# Altium footprint library Cyberdeck.PcbLib: 261 footprints (part 3 of 17)
Each footprint in its own frame and in the unit in brackets; x right, y up, seen from the top. Pads: shape width x height; smd on the part's side, far side on the other; paste and mask are expansions set on the pad; w line width, h text height; cw(c..) or ccw(c..) is an arc to the next point about the centre after c.
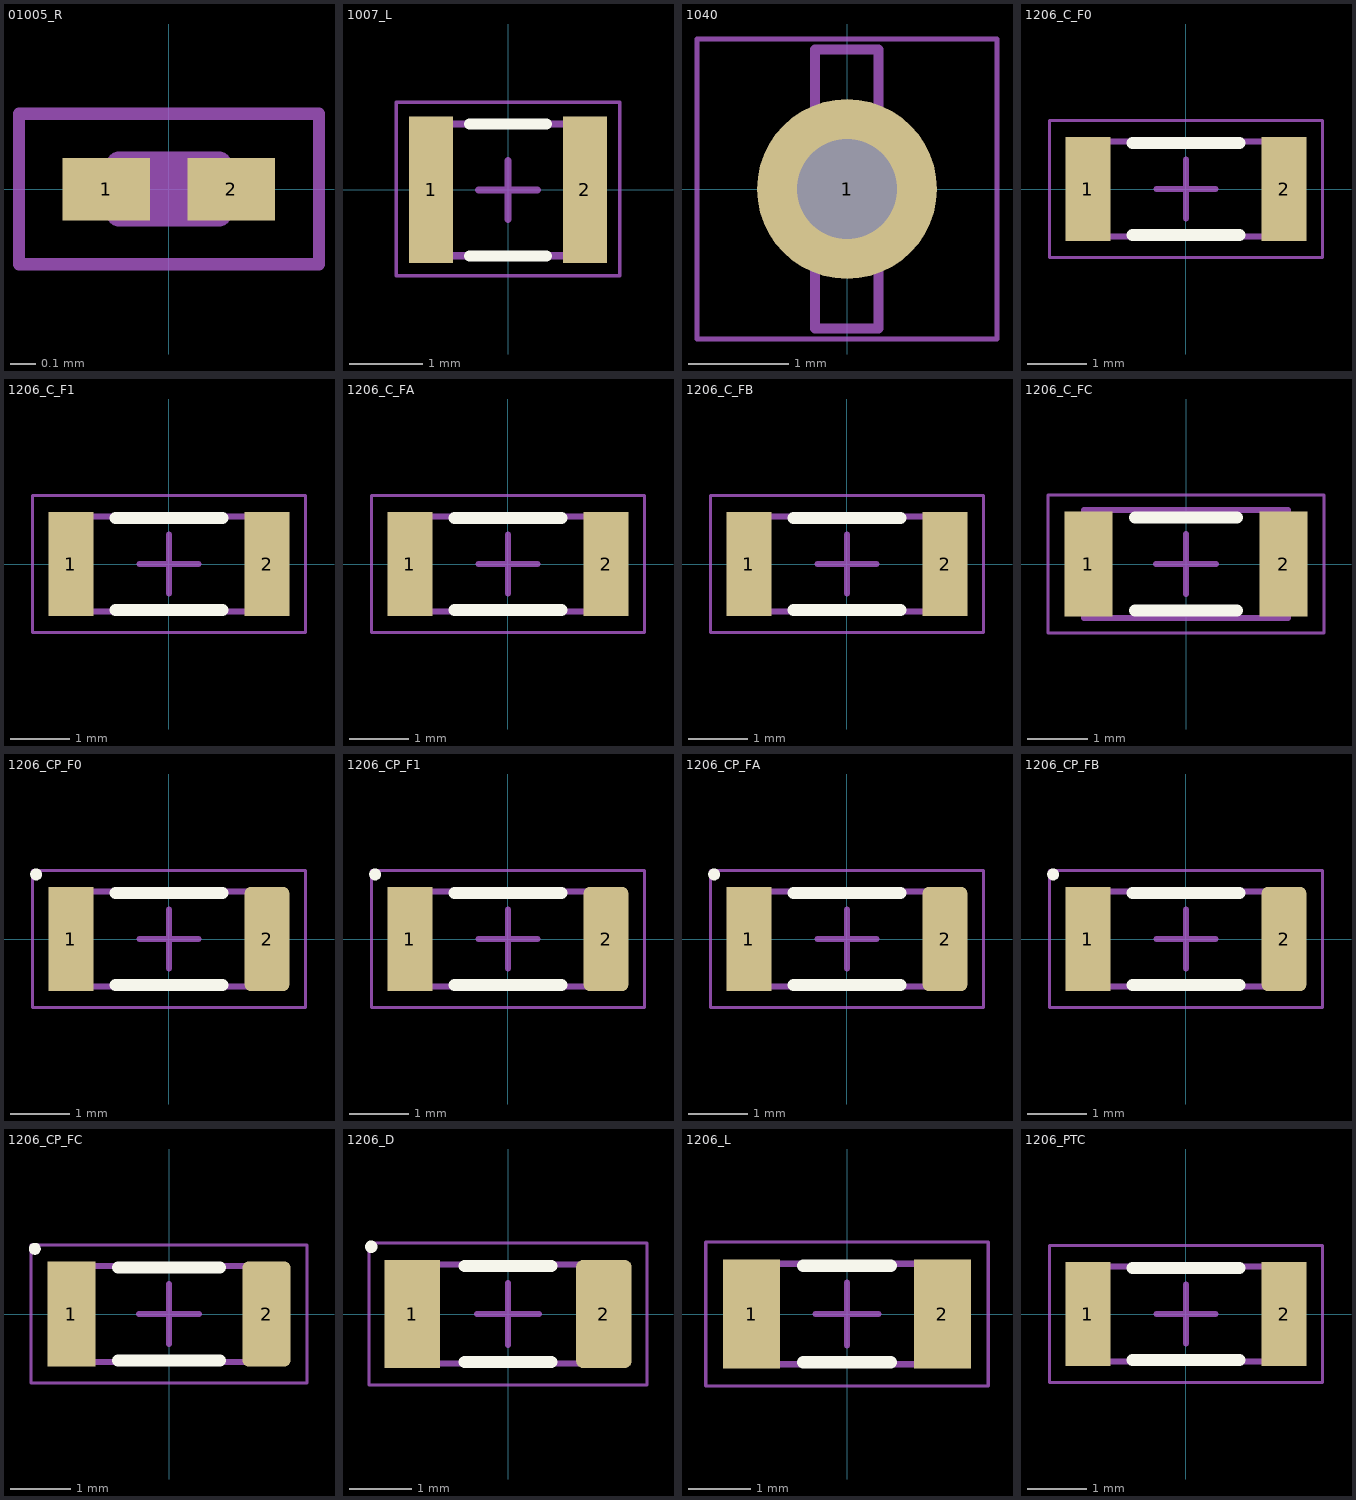
[diagram p2: the footprints below, top view; thin cyan lines are the x and y axes]

## 01005_R [mm] "Chip Resistor, 2-Leads, Body 0.40x0.20mm, IPC Medium Density"
height 0.13
pads (2):
  rect 0.35x0.25 smd: 1(-0.25,0) 2(0.25,0)
Assembly Top:
  lines w0.1: -0.2,-0.1 -0.2,0.1 0.2,0.1 0.2,-0.1 -0.2,-0.1
Courtyard Top:
  lines w0.05: -0.6,-0.3 -0.6,0.3 0.6,0.3 0.6,-0.3 -0.6,-0.3
  lines w0.1: -0.1,0 0.1,0 ; 0,-0.1 0,0.1
3D body "01005_R.step": height 0.13, standoff 0, extent -0.2,-0.1 0.2,0.1

## 1007_L [mm] "1007_L"
height 1.8
pads (2):
  rect 0.6x2 smd: 1(-1.05,0) 2(1.05,0)
Top Overlay:
  lines w0.15: -0.525,-0.9 0.525,-0.9 ; -0.525,0.9 0.525,0.9
Assembly Top:
  lines w0.1: -1.25,-0.9 -1.25,0.9 1.25,0.9 1.25,-0.9 -1.25,-0.9
Courtyard Top:
  lines w0.05: -1.525,-1.175 -1.525,1.2 1.525,1.2 1.525,-1.175 -1.525,-1.175
  lines w0.1: -0.4,0 0.4,0 ; 0,-0.4 0,0.4
3D body "User Library-IND_1007.STEP": height 1.81, standoff 0.01, extent -1.25,-0.9 1.25,0.9
3D body: height 8.5, standoff -3, extent 0,0.025 0,0.025

## 1040 [mm] "1040"
height 7
pads (1):
  round 1.8 hole 1: 1(0,0)
Assembly Top:
  lines w0.1: -0.318,-1.397 -0.318,1.397 0.317,1.397 0.317,-1.397 -0.318,-1.397
Courtyard Top:
  lines w0.05: -1.5,-1.5 1.5,-1.5 1.5,1.5 -1.5,1.5 -1.5,-1.5
  lines w0.1: -0.5,0 0.5,0 0,0 0,0.5 0,-0.5
3D body "keystone-PN1040.STEP": height 7, standoff -2.91, extent -0.318,-1.397 0.317,1.397

## 1206_C_F0 [mm] "1206_C_F0"
height 0.85
pads (2):
  rect 0.75x1.75 smd: 1(-1.65,0) 2(1.65,0)
Top Overlay:
  lines w0.2: -0.9,-0.775 0.9,-0.775 ; -0.9,0.775 0.9,0.775
Assembly Top:
  lines w0.1: -1.6,-0.8 1.6,-0.8 1.6,0.8 -1.6,0.8 -1.6,-0.8
Courtyard Top:
  lines w0.05: -2.3,-1.15 2.3,-1.15 2.3,1.15 -2.3,1.15 -2.3,-1.15
  lines w0.1: -0.5,0 0.5,0 ; 0,-0.5 0,0.5
3D body: height 0.85, standoff 0, extent 1.35,-0.8 1.6,0.8
3D body: height 0.85, standoff 0, extent -1.6,-0.8 -1.35,0.8
3D body: height 0.85, standoff 0, extent -1.35,-0.8 1.35,0.8

## 1206_C_F1 [mm] "1206_C_F1"
height 1
pads (2):
  rect 0.75x1.75 smd: 1(-1.65,0) 2(1.65,0)
Top Overlay:
  lines w0.2: -0.9,-0.775 0.9,-0.775 ; -0.9,0.775 0.9,0.775
Assembly Top:
  lines w0.1: -1.6,-0.8 1.6,-0.8 1.6,0.8 -1.6,0.8 -1.6,-0.8
Courtyard Top:
  lines w0.05: -2.3,-1.15 2.3,-1.15 2.3,1.15 -2.3,1.15 -2.3,-1.15
  lines w0.1: -0.5,0 0.5,0 ; 0,-0.5 0,0.5
3D body: height 1, standoff 0, extent 1.35,-0.8 1.6,0.8
3D body: height 1, standoff 0, extent -1.6,-0.8 -1.35,0.8
3D body: height 1, standoff 0, extent -1.35,-0.8 1.35,0.8

## 1206_C_FA [mm] "1206_C_FA"
height 1.15
pads (2):
  rect 0.75x1.75 smd: 1(-1.65,0) 2(1.65,0)
Top Overlay:
  lines w0.2: -0.9,-0.775 0.9,-0.775 ; -0.9,0.775 0.9,0.775
Assembly Top:
  lines w0.1: -1.6,-0.8 1.6,-0.8 1.6,0.8 -1.6,0.8 -1.6,-0.8
Courtyard Top:
  lines w0.05: -2.3,-1.15 2.3,-1.15 2.3,1.15 -2.3,1.15 -2.3,-1.15
  lines w0.1: -0.5,0 0.5,0 ; 0,-0.5 0,0.5
3D body: height 1.15, standoff 0, extent 1.35,-0.8 1.6,0.8
3D body: height 1.15, standoff 0, extent -1.6,-0.8 -1.35,0.8
3D body: height 1.15, standoff 0, extent -1.35,-0.8 1.35,0.8

## 1206_C_FB [mm] "1206_C_FB"
height 1.6
pads (2):
  rect 0.75x1.75 smd: 1(-1.65,0) 2(1.65,0)
Top Overlay:
  lines w0.2: -0.9,-0.775 0.9,-0.775 ; -0.9,0.775 0.9,0.775
Assembly Top:
  lines w0.1: -1.6,-0.8 -1.6,0.8 1.6,0.8 1.6,-0.8 -1.6,-0.8
Courtyard Top:
  lines w0.05: -2.3,-1.15 -2.3,1.15 2.3,1.15 2.3,-1.15 -2.3,-1.15
  lines w0.1: -0.5,0 0.5,0 ; 0,-0.5 0,0.5
3D body: height 1.6, standoff 0, extent -1.35,-0.8 1.35,0.8
3D body: height 1.6, standoff 0, extent -1.6,-0.8 -1.35,0.8
3D body: height 1.6, standoff 0, extent 1.35,-0.8 1.6,0.8

## 1206_C_FC [mm] "1206_C_FC"
height 1.6
pads (2):
  rect 0.8x1.75 smd: 1(-1.625,0) 2(1.625,0)
Top Overlay:
  lines w0.2: -0.85,-0.775 0.85,-0.775 ; -0.85,0.775 0.85,0.775
Assembly Top:
  lines w0.1: -1.7,-0.9 -1.7,0.9 1.7,0.9 1.7,-0.9 -1.7,-0.9
Courtyard Top:
  lines w0.05: -2.3,-1.15 -2.3,1.15 2.3,1.15 2.3,-1.15 -2.3,-1.15
  lines w0.1: -0.5,0 0.5,0 ; 0,-0.5 0,0.5
3D body "CAPC-1206-T1.8-BN.stp": height 1.8, standoff 0, extent -1.7,-0.9 1.7,0.9

## 1206_CP_F0 [mm] "1206_CP_F0"
height 0.85
pads (2):
  rect 0.75x1.75 smd: 1(-1.65,0)
  rrect25% 0.75x1.75 smd: 2(1.65,0)
Top Overlay:
  circle w0.1: c-2.237,1.087 r0.05
  lines w0.2: -0.9,-0.775 0.9,-0.775 ; -0.9,0.775 0.9,0.775
Assembly Top:
  lines w0.1: -1.6,-0.8 -1.6,0.8 1.6,0.8 1.6,-0.8 -1.6,-0.8
Courtyard Top:
  lines w0.05: -2.3,-1.15 -2.3,1.15 2.3,1.15 2.3,-1.15 -2.3,-1.15
  lines w0.1: -0.5,0 0.5,0 ; 0,-0.5 0,0.5
3D body: height 0.85, standoff 0, extent -1.35,-0.8 1.35,0.8
3D body: height 0.85, standoff 0, extent -1.6,-0.8 -1.35,0.8
3D body: height 0.85, standoff 0, extent 1.35,-0.8 1.6,0.8

## 1206_CP_F1 [mm] "1206_CP_F1"
height 1
pads (2):
  rect 0.75x1.75 smd: 1(-1.65,0)
  rrect25% 0.75x1.75 smd: 2(1.65,0)
Top Overlay:
  circle w0.1: c-2.237,1.087 r0.05
  lines w0.2: -0.9,-0.775 0.9,-0.775 ; -0.9,0.775 0.9,0.775
Assembly Top:
  lines w0.1: -1.6,-0.8 -1.6,0.8 1.6,0.8 1.6,-0.8 -1.6,-0.8
Courtyard Top:
  lines w0.05: -2.3,-1.15 -2.3,1.15 2.3,1.15 2.3,-1.15 -2.3,-1.15
  lines w0.1: -0.5,0 0.5,0 ; 0,-0.5 0,0.5
3D body: height 1, standoff 0, extent -1.35,-0.8 1.35,0.8
3D body: height 1, standoff 0, extent -1.6,-0.8 -1.35,0.8
3D body: height 1, standoff 0, extent 1.35,-0.8 1.6,0.8

## 1206_CP_FA [mm] "1206_CP_FA"
height 1.15
pads (2):
  rect 0.75x1.75 smd: 1(-1.65,0)
  rrect25% 0.75x1.75 smd: 2(1.65,0)
Top Overlay:
  circle w0.1: c-2.237,1.087 r0.05
  lines w0.2: -0.9,-0.775 0.9,-0.775 ; -0.9,0.775 0.9,0.775
Assembly Top:
  lines w0.1: -1.6,-0.8 -1.6,0.8 1.6,0.8 1.6,-0.8 -1.6,-0.8
Courtyard Top:
  lines w0.05: -2.3,-1.15 -2.3,1.15 2.3,1.15 2.3,-1.15 -2.3,-1.15
  lines w0.1: -0.5,0 0.5,0 ; 0,-0.5 0,0.5
3D body: height 1.15, standoff 0, extent -1.35,-0.8 1.35,0.8
3D body: height 1.15, standoff 0, extent -1.6,-0.8 -1.35,0.8
3D body: height 1.15, standoff 0, extent 1.35,-0.8 1.6,0.8

## 1206_CP_FB [mm] "1206_CP_FB"
height 1.6
pads (2):
  rect 0.75x1.75 smd: 1(-1.65,0)
  rrect25% 0.75x1.75 smd: 2(1.65,0)
Top Overlay:
  circle w0.1: c-2.237,1.087 r0.05
  lines w0.2: -0.9,-0.775 0.9,-0.775 ; -0.9,0.775 0.9,0.775
Assembly Top:
  lines w0.1: -1.6,-0.8 1.6,-0.8 1.6,0.8 -1.6,0.8 -1.6,-0.8
Courtyard Top:
  lines w0.05: -2.3,-1.15 2.3,-1.15 2.3,1.15 -2.3,1.15 -2.3,-1.15
  lines w0.1: -0.5,0 0.5,0 ; 0,-0.5 0,0.5
3D body: height 1.6, standoff 0, extent 1.35,-0.8 1.6,0.8
3D body: height 1.6, standoff 0, extent -1.6,-0.8 -1.35,0.8
3D body: height 1.6, standoff 0, extent -1.35,-0.8 1.35,0.8

## 1206_CP_FC [mm] "1206_CP_FC"
height 1.6
pads (2):
  rect 0.8x1.75 smd: 1(-1.625,0)
  rrect25% 0.8x1.75 smd: 2(1.625,0)
Top Overlay:
  circle w0.1: c-2.237,1.087 r0.05
  lines w0.2: -0.85,-0.775 0.85,-0.775 ; -0.85,0.775 0.85,0.775
Assembly Top:
  lines w0.1: -1.6,-0.8 1.6,-0.8 1.6,0.8 -1.6,0.8 -1.6,-0.8
Courtyard Top:
  lines w0.05: -2.3,-1.15 2.3,-1.15 2.3,1.15 -2.3,1.15 -2.3,-1.15
  lines w0.1: -0.5,0 0.5,0 ; 0,-0.5 0,0.5
3D body: height 1.6, standoff 0, extent 1.3,-0.8 1.6,0.8
3D body: height 1.6, standoff 0, extent -1.6,-0.8 -1.3,0.8
3D body: height 1.6, standoff 0, extent -1.3,-0.8 1.3,0.8

## 1206_D [mm] "1206_D"
height 0.55
pads (2):
  rect 0.9x1.75 smd: 1(-1.55,0)
  rrect25% 0.9x1.75 smd: 2(1.55,0)
Top Overlay:
  circle w0.1: c-2.212,1.087 r0.05
  lines w0.2: -0.7,-0.775 0.7,-0.775 ; -0.7,0.775 0.7,0.775
Assembly Top:
  lines w0.1: -1.55,-0.8 -1.55,0.8 1.55,0.8 1.55,-0.8 -1.55,-0.8
Courtyard Top:
  lines w0.05: -2.25,-1.15 -2.25,1.15 2.25,1.15 2.25,-1.15 -2.25,-1.15
  lines w0.1: -0.5,0 0.5,0 ; 0,-0.5 0,0.5
3D body: height 0.55, standoff 0, extent -1.12,-0.8 1.12,0.8
3D body: height 0.55, standoff 0, extent -1.55,-0.8 -1.12,0.8
3D body: height 0.55, standoff 0, extent 1.12,-0.8 1.55,0.8

## 1206_L [mm] "1206_L"
height 0.55
pads (2):
  rect 0.91x1.74 smd: 1(-1.52,0) 2(1.52,0)
Top Overlay:
  lines w0.2: -0.7,-0.77 0.7,-0.77 ; -0.7,0.77 0.7,0.77
Assembly Top:
  lines w0.1: -1.55,-0.8 -1.55,0.8 1.55,0.8 1.55,-0.8 -1.55,-0.8
Courtyard Top:
  lines w0.05: -2.25,-1.15 -2.25,1.15 2.25,1.15 2.25,-1.15 -2.25,-1.15
  lines w0.1: -0.5,0 0.5,0 ; 0,-0.5 0,0.5
3D body: height 0.55, standoff 0, extent -1.12,-0.8 1.12,0.8
3D body: height 0.55, standoff 0, extent -1.55,-0.8 -1.12,0.8
3D body: height 0.55, standoff 0, extent 1.12,-0.8 1.55,0.8

## 1206_PTC [mm] "1206_PTC"
height 1.8
pads (2):
  rect 0.75x1.75 smd: 1(-1.65,0) 2(1.65,0)
Top Overlay:
  lines w0.2: -0.9,-0.775 0.9,-0.775 ; -0.9,0.775 0.9,0.775
Assembly Top:
  lines w0.1: -1.6,-0.8 -1.6,0.8 1.6,0.8 1.6,-0.8 -1.6,-0.8
Courtyard Top:
  lines w0.05: -2.3,-1.15 -2.3,1.15 2.3,1.15 2.3,-1.15 -2.3,-1.15
  lines w0.1: -0.5,0 0.5,0 ; 0,-0.5 0,0.5
3D body: height 1.8, standoff 0, extent -1.35,-0.8 1.35,0.8
3D body: height 1.8, standoff 0, extent -1.6,-0.8 -1.35,0.8
3D body: height 1.8, standoff 0, extent 1.35,-0.8 1.6,0.8